# Altium footprint library Miscellaneous footprints.PcbLib: 84 footprints (part 6 of 6)
Each footprint in its own frame and in the unit in brackets; x right, y up, seen from the top. Pads: shape width x height; smd on the part's side, far side on the other; paste and mask are expansions set on the pad; w line width, h text height; cw(c..) or ccw(c..) is an arc to the next point about the centre after c.
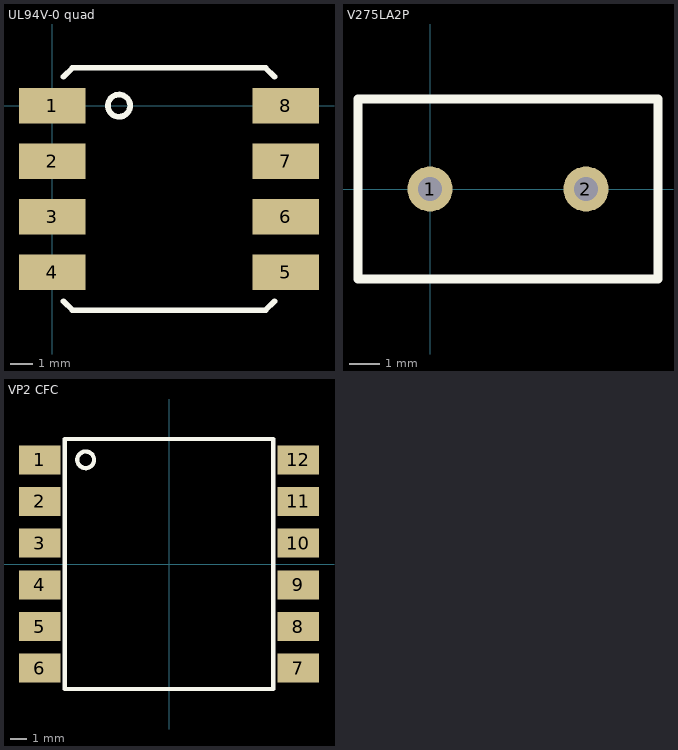
[diagram p5: the footprints below, top view; thin cyan lines are the x and y axes]

## UL94V-0 quad [mm] "CFC_4L"
height 7.3
pads (8):
  rect 3x1.6 smd: 1(0,0) 2(0,-2.5) 3(0,-5) 4(0,-7.5) 5(10.5,-7.5) 6(10.5,-5) 7(10.5,-2.5) 8(10.5,0)
Top Overlay:
  circle w0.254: c3,0 r0.5
  lines w0.254: 0.5,-8.8 0.9,-9.2 9.6,-9.2 10,-8.8 ; 0.5,1.3 0.9,1.7 9.6,1.7 10,1.3

## V275LA2P [mm] "V275LA2P"
pads (2):
  round 1.5 hole 0.8: 1(0,0) 2(5.2,0)
Top Overlay:
  lines w0.3: -2.4,-3 7.6,-3 7.6,3 -2.4,3 -2.4,0 -2.4,-3
3D body: height 13, standoff 0, extent -2.399,-2.999 7.599,2.999

## VP2 CFC [mm] "Chocke/Transformer"
height 7.8
pads (12):
  rect 2.5x1.75 smd: 1(-7.75,6.25) 2(-7.75,3.75) 3(-7.75,1.25) 4(-7.75,-1.25) 5(-7.75,-3.75) 6(-7.75,-6.25) 7(7.75,-6.25) 8(7.75,-3.75) 9(7.75,-1.25) 10(7.75,1.25) 11(7.75,3.75) 12(7.75,6.25)
Top Overlay:
  circle w0.254: c-5,6.25 r0.5
  lines w0.254: -6.25,-7.5 6.25,-7.5 6.25,7.5 -6.25,7.5 -6.25,-7.5
3D body: height 7.8, standoff 0, extent -6.25,-7.5 6.25,7.5

## ZhagaRadarAddon [mm]
3D body: height 29.95, standoff -2.99, extent -1.825,-1.275 27.955,24.03